# Altium footprint library lib_protel_HC_BOINA.PCBLIB: 726 footprints (part 31 of 46)
Each footprint in its own frame and in the unit in brackets; x right, y up, seen from the top. Pads: shape width x height; smd on the part's side, far side on the other; paste and mask are expansions set on the pad; w line width, h text height; cw(c..) or ccw(c..) is an arc to the next point about the centre after c.
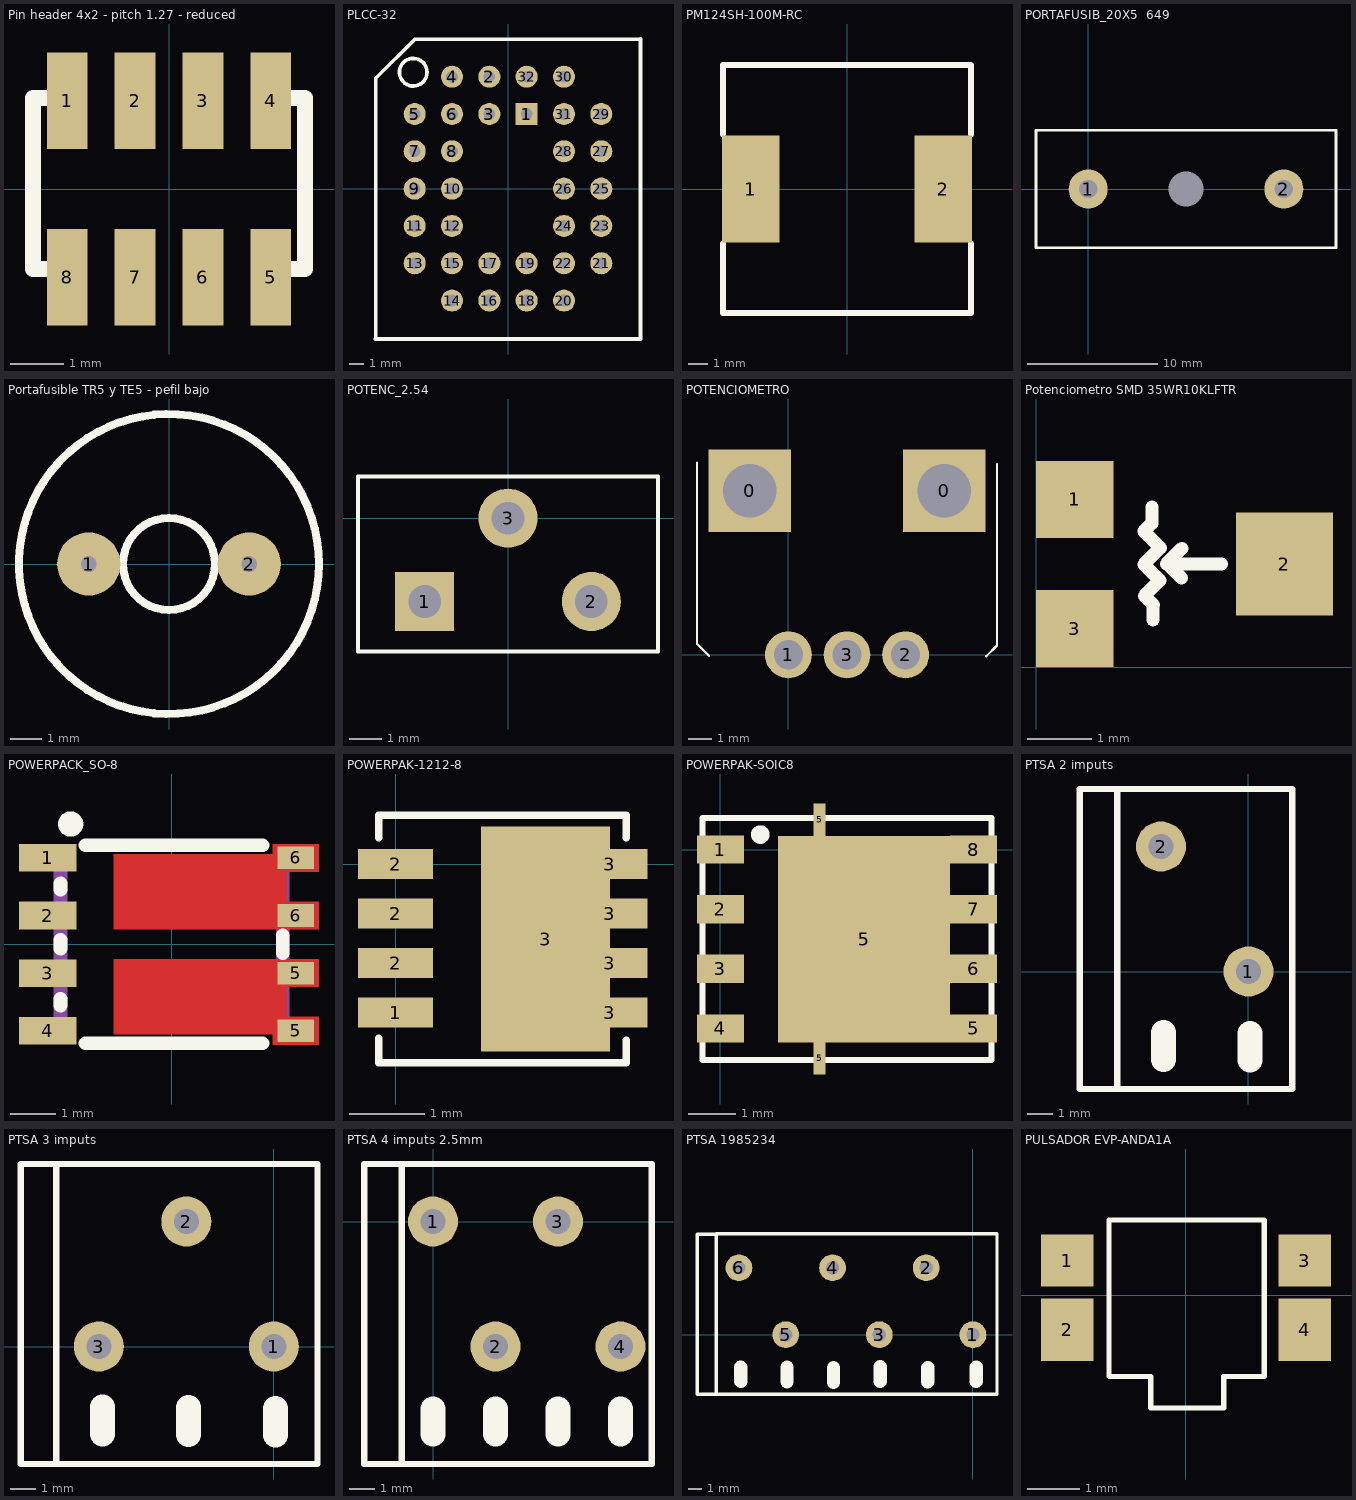
[diagram p30: the footprints below, top view; thin cyan lines are the x and y axes]

## Pin header 4x2 - pitch 1.27 - reduced [mm] "Pin header 4x2 - pitch 1.27"
height 5
pads (8):
  rect 0.76x1.8 smd: 1(-1.905,1.65) 2(-0.635,1.65) 3(0.635,1.65) 4(1.905,1.65) 5(1.905,-1.65) 6(0.635,-1.65) 7(-0.635,-1.65) 8(-1.905,-1.65)
Top Overlay:
  lines w0.3: -2.3,-1.5 -2.54,-1.5 -2.54,1.7 -2.3,1.7 ; 2.3,-1.5 2.54,-1.5 2.54,1.7 2.3,1.7

## PLCC-32 [mm]
pads (32):
  rect 1.5x1.5 on Top hole 0.8: 1(1.27,5.08)
  round 1.5 on Top hole 0.8: 2(-1.27,7.62) 3(-1.27,5.08) 4(-3.81,7.62) 5(-6.35,5.08) 6(-3.81,5.08) 7(-6.35,2.54) 8(-3.81,2.54) 9(-6.35,0) 10(-3.81,0) 11(-6.35,-2.54) 12(-3.81,-2.54) 13(-6.35,-5.08) 14(-3.81,-7.62) 15(-3.81,-5.08) 16(-1.27,-7.62) 17(-1.27,-5.08) 18(1.27,-7.62) 19(1.27,-5.08) 20(3.81,-7.62) 21(6.35,-5.08) 22(3.81,-5.08) 23(6.35,-2.54) 24(3.81,-2.54) 25(6.35,0) 26(3.81,0) 27(6.35,2.54) 28(3.81,2.54) 29(6.35,5.08) 30(3.81,7.62) 31(3.81,5.08) 32(1.27,7.62)
Top Overlay:
  circle w0.254: c-6.452,7.925 r0.94
  lines w0.254: -9.017,-10.236 9.017,-10.236 9.017,10.185 -6.35,10.16 -9,7.51 -9,-10.22

## PM124SH-100M-RC [mm] "Inductor 12.5x12.5"
height 4
pads (2):
  rect 2.9x5.4 smd: 1(-4.85,0) 2(4.85,0)
Top Overlay:
  lines w0.3: -6.25,-2.75 -6.25,-6.25 6.25,-6.25 6.25,-2.75 ; -6.25,2.75 -6.25,6.25 6.25,6.25 6.25,2.75

## PORTAFUSIB_20X5  649 [mm] "PORTAFUSIBLE LITTELFUSE 649"
height 13
pads (3):
  round 0 hole 2.7 mask+0.1: 0(7.5,0)
  round 3 hole 1.4 mask+0.1: 1(0,0) 2(15,0)
Top Overlay:
  lines w0.2: -4,-4.5 19,-4.5 19,4.5 -4,4.5 -4,-4.49

## Portafusible TR5 y TE5 - pefil bajo [mm]
pads (2):
  round 2 on Top hole 0.5: 1(-2.54,0) 2(2.54,0)
Top Overlay:
  circle w0.254: c0,0 r1.458
  circle w0.254: c0,0 r4.75
  circle w0.254: c-2.54,0 r0.5
  circle w0.254: c2.54,0 r0.5

## POTENC_2.54 [mm]
pads (3):
  rect 1.8x1.8 on Top hole 1: 1(-2.54,-2.54)
  round 1.8 on Top hole 1: 2(2.54,-2.54) 3(0,0)
Top Overlay:
  lines w0.127: -4.572,-4.064 -4.572,1.27 4.572,1.27 4.572,-4.064 -4.572,-4.064

## POTENCIOMETRO [mm]
pads (5):
  rect 3.5x3.5 hole 2.3 square: 0(-1.65,7) 0(6.65,7)
  round 2 hole 1.25: 1(0,0) 2(5,0) 3(2.5,0)
Top Overlay:
  lines w0.1: -3.9,8.2 -3.9,0.47 -3.39,-0.04 ; 8.44,-0.06 8.9,0.4 8.9,8.14

## Potenciometro SMD 35WR10KLFTR [mm]
height 3.5
pads (3):
  rect 1.2x1.2 smd: 1(0.6,2.6) 3(0.6,0.6)
  rect 1.5x1.6 smd: 2(3.85,1.6)
Top Overlay:
  lines w0.1: 1.812,0.957 1.82,0.965 ; 2.021,1.602 2.037,1.602
  lines w0.203: 1.796,2.479 1.796,2.231 1.672,2.107 1.928,1.851 1.672,1.595 1.921,1.346 1.68,1.105 1.804,0.981 1.82,0.965 ; 1.812,0.732 1.812,0.957 ; 2.037,1.602 2.254,1.385 ; 2.262,1.843 2.021,1.602 2.875,1.602

## POWERPACK_SO-8 [mm]
height 1.04
pads (8):
  rect 1.27x0.61 smd: 1(-2.73,1.905) 2(-2.73,0.635) 3(-2.73,-0.635) 4(-2.73,-1.905)
  rect 0.8x0.5 smd: 5(2.73,-1.905) 5(2.73,-0.635) 6(2.73,0.635) 6(2.73,1.905)
Top Layer:
  region: 2.225,-1.98 2.225,-2.21 3.245,-2.21 3.245,-1.6 2.535,-1.6 2.535,-0.94 3.245,-0.94 3.245,-0.33 -1.275,-0.33 -1.275,-1.98
  region: 2.225,1.98 2.225,2.21 3.245,2.21 3.245,1.6 2.535,1.6 2.535,0.94 3.245,0.94 3.245,0.33 -1.275,0.33 -1.275,1.98
Top Overlay:
  circle w0.305: c-2.225,2.65 r0.125
  lines w0.3: -2.45,-1.35 -2.45,-1.2 ; -2.45,-0.1 -2.45,0.1 ; -2.45,1.2 -2.45,1.35 ; -1.9,-2.18 2,-2.18 ; -1.9,2.18 2,2.18 ; 2.45,-0.2 2.45,0.2
Mechanical 13:
  lines w0.3: -2.45,-1.88 -2.45,1.88 ; 2.45,-1.88 2.45,1.88
3D body "User Library-PowerPAK_SO8_single.step": height 1.12, standoff 0, extent -3.12,-2.625 3.12,2.625

## POWERPAK-1212-8 [mm]
height 0.28
pads (9):
  rect 1x0.4 smd: 1(0,-1.98) 2(0,-1.32) 2(0,-0.66) 2(0,0) 3(2.86,-1.98) 3(2.86,-1.32) 3(2.86,-0.66) 3(2.86,0)
  rect 1.725x3 smd mask+0: 3(2,-1)
Top Overlay:
  lines w0.1: 3.075,0.35 3.075,0.65 -0.225,0.65 -0.225,0.35 ; -0.225,-2.325 -0.225,-2.65 3.075,-2.65 3.075,-2.35 ; -0.225,-2.325 -0.225,-2.325 ; -0.225,0.35 -0.225,0.35 ; 3.075,-2.35 3.075,-2.35

## POWERPAK-SOIC8 [mm]
pads (11):
  rect 1x0.6 smd: 1(0,0) 2(0,-1.27) 3(0,-2.54) 4(0,-3.81) 5(5.39,-3.81) 6(5.39,-2.54) 7(5.39,-1.27) 8(5.39,0)
  rect 0.25x0.7 smd mask+0: 5(2.11,-4.44) 5(2.11,0.63)
  rect 3.66x4.4 smd mask+0: 5(3.06,-1.91)
Top Overlay:
  circle w0.254: c0.849,0.32 r0.071
  lines w0.127: -0.38,-4.48 5.77,-4.48 5.77,0.67 -0.38,0.67 -0.38,-4.48

## PTSA 2 imputs [mm] "CONECTOR 45º Cable to board"
height 13.1
pads (2):
  round 2 hole 1: 1(0,0) 2(-3.5,5)
Top Overlay:
  lines w0.254: -5.25,-4.7 -5.25,7.3 ; -6.75,-4.7 -6.75,7.3 1.75,7.3 1.75,-4.7 -6.75,-4.7
  lines w1: -3.405,-3.511 -3.405,-2.448 ; 0.068,-3.549 0.068,-2.486
3D body "17647.stp": height 13.1, standoff -3.5, extent -6.75,-4.7 1.75,7.3

## PTSA 3 imputs [mm] "CONECTOR 45º"
height 13.1
pads (3):
  round 2 hole 1: 1(0,0) 2(-3.5,5) 3(-7,0)
Top Overlay:
  lines w0.254: -10.118,7.256 -10.123,7.251 -10.123,-4.687 -10.134,-4.698 -8.682,-4.698 ; -10.118,7.3 -8.739,7.3 ; -8.704,-4.7 1.75,-4.7 1.75,7.3 -8.704,7.3 ; -8.704,-4.7 -8.704,7.3 ; -8.704,7.3 -8.704,7.3 ; -8.704,-4.7 -8.703,-4.7
  lines w1: -6.859,-3.492 -6.859,-2.429 ; -3.405,-3.511 -3.405,-2.448 ; 0.068,-3.549 0.068,-2.486
3D body "17648.stp": height 13.1, standoff -3.5, extent -10.25,-4.7 1.75,7.3

## PTSA 4 imputs 2.5mm [mm] "CONECTOR 45º"
height 13.1
pads (4):
  round 2 hole 1: 1(0,0) 2(2.5,-5) 3(5,0) 4(7.5,-5)
Top Overlay:
  lines w0.254: -1.25,-9.7 -1.25,2.3 ; -2.75,-9.7 8.75,-9.7 8.75,2.3 -2.75,2.3 -2.75,-9.7
  lines w1: 0,-8.5 0,-7.5 ; 2.5,-8.5 2.5,-7.5 ; 5,-8.5 5,-7.5 ; 7.5,-8.5 7.5,-7.5
3D body "17712.stp": height 13.15, standoff -3.45, extent -2.75,-9.8 8.75,2.2

## PTSA 1985234 [mm] "CONECTOR 45º"
height 13.1
pads (6):
  round 2 hole 1: 1(0,0) 2(-3.5,5) 3(-7,0) 4(-10.5,5) 5(-14,0) 6(-17.5,5)
Top Overlay:
  lines w0.254: -19.239,7.501 -20.618,7.501 -20.623,7.496 -20.623,-4.442 -20.634,-4.453 -19.182,-4.453 ; -19.204,-4.455 -19.203,-4.455 ; -19.204,-4.455 1.796,-4.455 1.796,7.545 -19.204,7.545 ; -19.204,-4.455 -19.204,7.545 ; -19.204,7.545 -19.204,7.545
  lines w1: -17.359,-3.492 -17.359,-2.429 ; -13.905,-3.511 -13.905,-2.448 ; -10.432,-3.549 -10.432,-2.486 ; -6.94,-3.473 -6.94,-2.41 ; -3.372,-3.53 -3.372,-2.467 ; 0.235,-3.492 0.235,-2.429

## PULSADOR EVP-ANDA1A [mm]
height 1.2
pads (4):
  rect 1x1 smd: 1(-2.275,0.663) 3(2.275,0.663)
  rect 1x1.2 smd: 2(-2.275,-0.663) 4(2.275,-0.663)
Top Overlay:
  lines w0.1: -1.475,-1.562 -1.475,1.438 1.5,1.438 1.5,-1.562 0.725,-1.562 0.725,-2.162 -0.675,-2.162 -0.675,-1.562 -1.475,-1.562
3D body "EVPAN-BD-A1A.STEP": height 0.7, standoff -0.5, extent -2.625,-2.175 2.575,1.425